# Altium footprint library 接插件封装库.PcbLib: 112 footprints (part 6 of 7)
Each footprint in its own frame and in the unit in brackets; x right, y up, seen from the top. Pads: shape width x height; smd on the part's side, far side on the other; paste and mask are expansions set on the pad; w line width, h text height; cw(c..) or ccw(c..) is an arc to the next point about the centre after c.
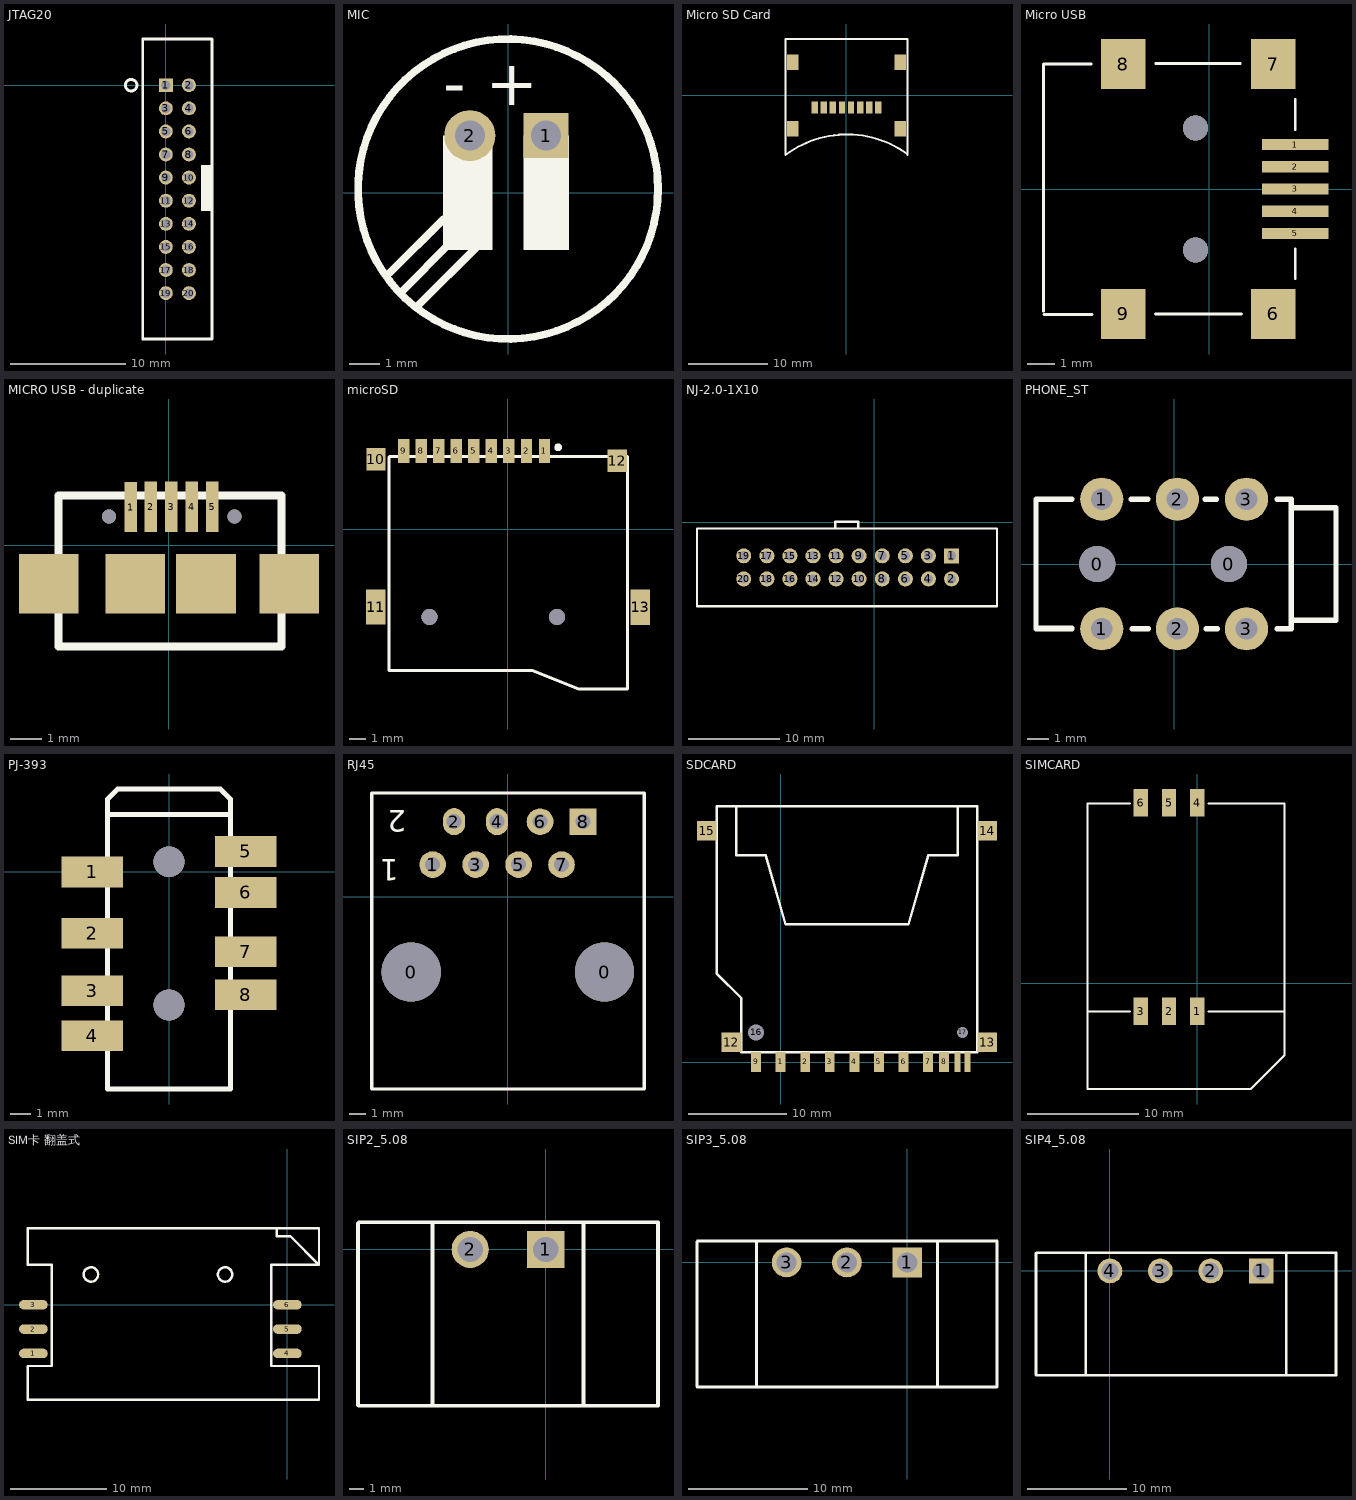
[diagram p5: the footprints below, top view; thin cyan lines are the x and y axes]

## JTAG20 [mm]
pads (20):
  rect 1.2x1.2 hole 0.8: 1(0,0)
  round 1.2 hole 0.8: 2(2,0) 3(0,-2) 4(2,-2) 5(0,-4) 6(2,-4) 7(0,-6) 8(2,-6) 9(0,-8) 10(2,-8) 11(0,-10) 12(2,-10) 13(0,-12) 14(2,-12) 15(0,-14) 16(2,-14) 17(0,-16) 18(2,-16) 19(0,-18) 20(2,-18)
Top Overlay:
  circle w0.254: c-3,0 r0.5
  rectangle: 3.048,-10.89 4.048,-8.89
  rectangle: 3.048,-8.893 4.048,-6.893
  lines w0.254: -2,-21.971 4,-21.971 4,4 3,4 -1,4 -2,4 -2,-21.971

## MIC [mm]
pads (2):
  rect 1.5x1.5 hole 1: 1(1.27,1.905)
  round 1.7 hole 1: 2(-1.27,1.905)
Top Overlay:
  circle w0.254: c0,0.127 r4.994
  rectangle: -2.159,-1.905 -0.508,1.905
  rectangle: 0.508,-1.905 2.032,1.905
  lines w0.254: -3.937,-2.667 -2.159,-0.889 ; -3.492,-3.238 -1.968,-1.714 ; -2.984,-3.746 -1.016,-1.778
  text "- +" at -2.159,2.921 h1.52
3D body: height 2, standoff 0, extent -1.567,1.606 -0.97,2.205
3D body: height 2, standoff 0, extent 0.972,1.606 1.57,2.205
3D body: height 7.7, standoff 1, extent -5.008,-4.863 4.953,5.117

## Micro SD Card [mil]
pads (12):
  rect 31.5x59.06 smd: 1(157.5,-60) 2(112.5,-60) 3(67.5,-60) 4(22.5,-60) 5(-22.5,-60) 6(-67.5,-60) 7(-112.5,-60) 8(-157.5,-60)
  rect 57.09x78.74 smd: ""(-267.5,165) ""(-267.5,-165) ""(267.5,-165) ""(267.5,165)
Top Overlay:
  lines w10: 299.53,-289.12 ccw(c2.5,-700) -302.5,-295 -302.5,280 302.5,280 302.5,-295

## Micro USB [mm]
pads (9):
  rect 2.4x0.4 smd: 1(3.1,1.6) 2(3.1,0.8) 3(3.1,0) 4(3.1,-0.8) 5(3.1,-1.6)
  rect 1.6x1.8 smd: 6(2.3,-4.5) 7(2.3,4.5) 8(-3.1,4.5) 9(-3.1,-4.5)
via -0.5,-2.2 diameter 0.9 hole 0.9
via -0.5,2.2 diameter 0.9 hole 0.9
Top Overlay:
  lines w0.1: -5.969,-4.4 -5.969,4.5 -4.242,4.5 ; -5.944,-4.521 -4.216,-4.521 ; -1.93,-4.496 1.168,-4.496 ; -1.92,4.521 1.118,4.521 ; 3.099,-3.226 3.099,-2.159 ; 3.099,2.134 3.099,3.226
3D body: height 3.95, standoff -1, extent -5.918,-5.325 3.282,5.375

## MICRO USB - duplicate [mm]
pads (9):
  rect 0.4x1.6 smd: 1(-1.216,1.214) 2(-0.575,1.225) 3(0.075,1.225) 4(0.725,1.225) 5(1.375,1.225)
  rect 1.9x1.9 smd: ""(-3.825,-1.225) ""(-1.075,-1.225) ""(1.175,-1.225) ""(3.825,-1.225)
via -1.905,0.914 diameter 0.45 hole 0.45
via 2.083,0.914 diameter 0.45 hole 0.45
Top Overlay:
  lines w0.254: -3.525,-3.225 -3.525,1.575 3.525,1.575 ; -3.475,-3.225 3.575,-3.225 3.575,1.575
3D body: height 2.54, standoff -0.46, extent -4.425,-3.775 4.375,1.825

## microSD [mm]
pads (13):
  rect 0.7x1.5 smd: 1(2.27,4.87) 2(1.155,4.87) 3(0.04,4.87) 4(-1.05,4.87) 5(-2.14,4.87) 6(-3.23,4.87) 7(-4.32,4.87) 8(-5.41,4.87) 9(-6.5,4.87)
  rect 1.2x1.4 smd: 10(-8.23,4.35) 12(6.81,4.27)
  rect 1.2x2.2 smd: 11(-8.25,-4.86) 13(8.25,-4.87)
via -4.905,-5.465 diameter 1 hole 1
via 3.055,-5.465 diameter 1 hole 1
Top Overlay:
  circle w0.254: c3.127,5.1 r0.113
  lines w0.2: -7.42,-8.82 -7.42,4.5 ; -7.41,-8.82 1.52,-8.82 4.41,-9.97 7.44,-9.97 7.44,4.51 ; -7.39,4.52 7.44,4.52

## NJ-2.0-1X10 [mil]
pads (20):
  rect 65x65 hole 40: 1(335.26,-144.22)
  round 65 hole 40: 2(335.26,-244.22) 3(235.26,-144.22) 4(235.26,-244.22) 5(135.26,-144.22) 6(135.26,-244.22) 7(35.26,-144.22) 8(35.26,-244.22) 9(-64.74,-144.22) 10(-64.74,-244.22) 11(-164.74,-144.22) 12(-164.74,-244.22) 13(-264.74,-144.22) 14(-264.74,-244.22) 15(-364.74,-144.22) 16(-364.74,-244.22) 17(-464.74,-144.22) 18(-464.74,-244.22) 19(-564.74,-144.22) 20(-564.74,-244.22)
Top Overlay:
  lines w10: -168.94,-24.12 -168.94,0.88 ; -168.94,2.88 -68.94,2.88 -68.94,-22.12 ; -767.1,-362.33 -767.1,-26.11 532.11,-26.11 532.11,-362.33 -767.1,-362.33

## PHONE_ST [mm]
pads (8):
  round 1.676 hole 1.676: 0(-3.556,0) 0(2.54,0)
  round 2 hole 1: 1(-3.35,-3) 1(-3.35,3) 2(0.15,-3) 2(0.15,3) 3(3.35,-3) 3(3.35,3)
Top Overlay:
  lines w0.254: -6.393,-2.969 -4.742,-2.969 ; -4.742,-3.007 -6.393,-3.007 -6.393,3 -4.742,3 ; -1.986,3 -1.224,3 ; -1.948,-3.007 -1.186,-3.007 ; 1.443,3 1.951,3 ; 1.481,-3.007 1.989,-3.007 ; 4.783,-3.007 5.33,-3.007 ; 4.783,3 5.418,3 5.418,-3.007 ; 5.418,-2.6 7.493,-2.6 7.493,2.6 5.418,2.6

## PJ-393 [mm] "3.5mm 音频连接器 4节"
height 5
pads (8):
  rect 3x1.5 smd: 1(-3.75,0) 2(-3.75,-3) 3(-3.75,-5.8) 4(-3.75,-8) 5(3.75,1) 6(3.75,-1) 7(3.75,-3.9) 8(3.75,-6)
via 0,0.5 diameter 1.5 hole 1.5
via 0,-6.5 diameter 1.5 hole 1.5
Top Overlay:
  lines w0.254: -3,2.8 -3,3.55 -2.5,4.05 2.5,4.05 3,3.55 3,2.8 ; -3,2.8 -3,2.8 ; -3,2.8 3,2.8 ; -3,2.8 -3,-10.6 3,-10.6 3,2.8
3D body: height 5.25, standoff -0.75, extent -4.5,-10.5 4.5,6.5

## RJ45 [mil]
height 78.35
pads (10):
  round 137.8 hole 137.8: 0(-225,-175) 0(225,-175)
  round 62 hole 35: 1(-175,75) 3(-75,75) 5(25,75) 6(75,175) 7(125,75)
  oval 51.18x62.99 hole 35: 2(-125,175) 4(-25,175)
  rect 62x62 hole 35: 8(175,175)
Top Overlay:
  lines w3.94: -316.54,-447.24 -316.54,-249.41
  lines w8: 317.32,-447.24 -316.54,-447.24 -316.54,241.67 317.32,241.67 317.32,-445.47
  text "1" at -253.74,87.99 h50
  text "2" at -236.81,200.98 h50
3D body: height 539.37, standoff -157.48, extent -315.75,-599.61 314.17,242.91

## SDCARD [mm]
pads (17):
  rect 1x2 smd: 1(0.007,0.016) 2(2.507,0.016) 3(5.007,0.016) 4(7.507,0.016) 5(10.007,0.016) 6(12.507,0.016) 7(15.007,0.016) 8(16.632,0.016) 9(-2.493,0.016)
  rect 0.6x2 smd: 10(19.007,0.016) 11(18.007,0.016)
  rect 2x2 smd: 12(-4.993,2.016) 13(21.007,2.016) 14(21.007,23.516) 15(-7.493,23.516)
  round 1.5 hole 1.6: 16(-2.493,3.016)
  round 1 hole 1.1: 17(18.507,3.016)
Top Overlay:
  lines w0.254: -4.493,26.016 -4.493,21.016 -1.493,21.016 0.507,14.016 13.007,14.016 15.007,21.016 18.007,21.016 18.007,26.016 ; -6.493,9.016 -3.993,6.516 -3.993,1.016 20.007,1.016 20.007,26.016 -6.493,26.016 -6.493,9.016

## SIMCARD [mm]
pads (6):
  rect 1.3x2.5 smd: 1(0,-2.5) 2(-2.55,-2.5) 3(-5.1,-2.5) 4(0,16.306) 5(-2.55,16.306) 6(-5.1,16.306)
Top Overlay:
  lines w0.203: -9.906,-9.525 -9.906,16.25 -6.102,16.25 ; -9.906,-2.54 -6.096,-2.54 ; -9.895,-9.525 3.175,-9.525 ; 1.016,-2.54 7.874,-2.54 ; 1.022,16.25 7.874,16.25 7.874,-6.13 ; 2.54,-9.525 4.826,-9.525 7.874,-6.477 7.874,-5.715 ; 7.874,-5.461 7.874,-1.524
3D body: height 2.83, standoff -0.8, extent -9.961,-8.305 7.239,17.195

## SIM卡 翻盖式 [mm]
height 2
pads (6):
  oval 3x1 smd: 1(-26.5,-5.08) 2(-26.5,-2.54) 3(-26.5,0) 4(0,-5.08) 5(0,-2.54) 6(0,0)
Top Overlay:
  circle w0.254: c-6.5,3.16 r0.75
  circle w0.254: c-20.5,3.16 r0.75
  lines w0.254: -1.1,7.96 -1.1,7.16 0.3,7.16 3.3,4.16 ; 3.3,4.16 -1.7,4.16 -1.7,-6.39 3.3,-6.39 3.3,-9.89 -27.1,-9.89 -27.1,-6.39 -24.6,-6.39 -24.6,4.16 -27.1,4.16 -27.1,7.96 -2.451,7.96 3.3,7.96 3.3,4.16
3D body: height 2.6, standoff -0.7, extent -26.48,-9.85 3.16,7.35

## SIP2_5.08 [mm]
pads (2):
  rect 2.5x2.5 hole 1.7: 1(0,0)
  round 2.5 hole 1.7: 2(-5.08,0)
Top Overlay:
  lines w0.254: -12.62,-3.21 -12.62,-10.453 -12.573,-10.5 7.54,-10.5 7.54,1.819 2.21,1.819 ; -12.604,-3.81 -12.62,-3.794 -12.62,-2.804 -12.62,1.762 -12.563,1.819 -7.188,1.819 ; -7.62,-10.5 -7.62,-3.769 -7.62,-3.21 -7.62,1.819 2.54,1.819 2.54,-10.5

## SIP3_5.08 [mm]
pads (3):
  rect 2.5x2.5 hole 1.7: 1(0,0)
  round 2.5 hole 1.7: 2(-5.08,0) 3(-10.16,0)
Top Overlay:
  lines w0.254: -17.7,-3.21 -17.7,-10.453 -17.653,-10.5 -12.725,-10.5 -12.7,-10.475 ; -17.684,-3.81 -17.7,-3.794 -17.7,-2.804 -17.7,1.762 -17.643,1.819 -12.7,1.819 ; 2.54,-10.5 2.54,-3.81 ; 2.54,-3.388 2.54,-3.81 ; 7.54,-3.286 7.54,-10.496 7.544,-10.5 2.489,-10.5 -12.7,-10.5 -12.7,-3.769 -12.7,-3.21 -12.7,1.819 ; 7.544,-3.794 7.528,-3.81 7.54,-3.798 7.54,-3.439 7.54,1.79 7.544,1.794 7.518,1.819 7.391,1.819 2.54,1.819 ; -12.7,1.819 -7.62,1.819 2.54,1.819 ; 2.54,-3.81 2.54,-3.312 2.54,1.819

## SIP4_5.08 [mm]
pads (4):
  rect 2.5x2.5 hole 1.7: 1(15.24,0)
  round 2.5 hole 1.7: 2(10.16,0) 3(5.08,0) 4(0,0)
Top Overlay:
  lines w0.254: -7.447,-3.21 -7.447,-10.453 -7.4,-10.5 ; -7.431,-3.81 -7.447,-3.794 -7.447,-2.804 -7.447,1.762 -7.39,1.819 -2.015,1.819 ; -7.373,-10.5 22.78,-10.5 22.78,-3.81 22.78,-3.312 22.78,1.819 12.649,1.819 ; -2.447,-10.5 -2.447,-3.769 -2.447,-3.21 -2.447,1.819 ; -2.26,1.819 12.7,1.819 ; 17.78,-10.5 17.78,1.819